# Altium footprint library JL_PCB.PCBLIB: 1129 footprints (part 8 of 72)
Each footprint in its own frame and in the unit in brackets; x right, y up, seen from the top. Pads: shape width x height; smd on the part's side, far side on the other; paste and mask are expansions set on the pad; w line width, h text height; cw(c..) or ccw(c..) is an arc to the next point about the centre after c.
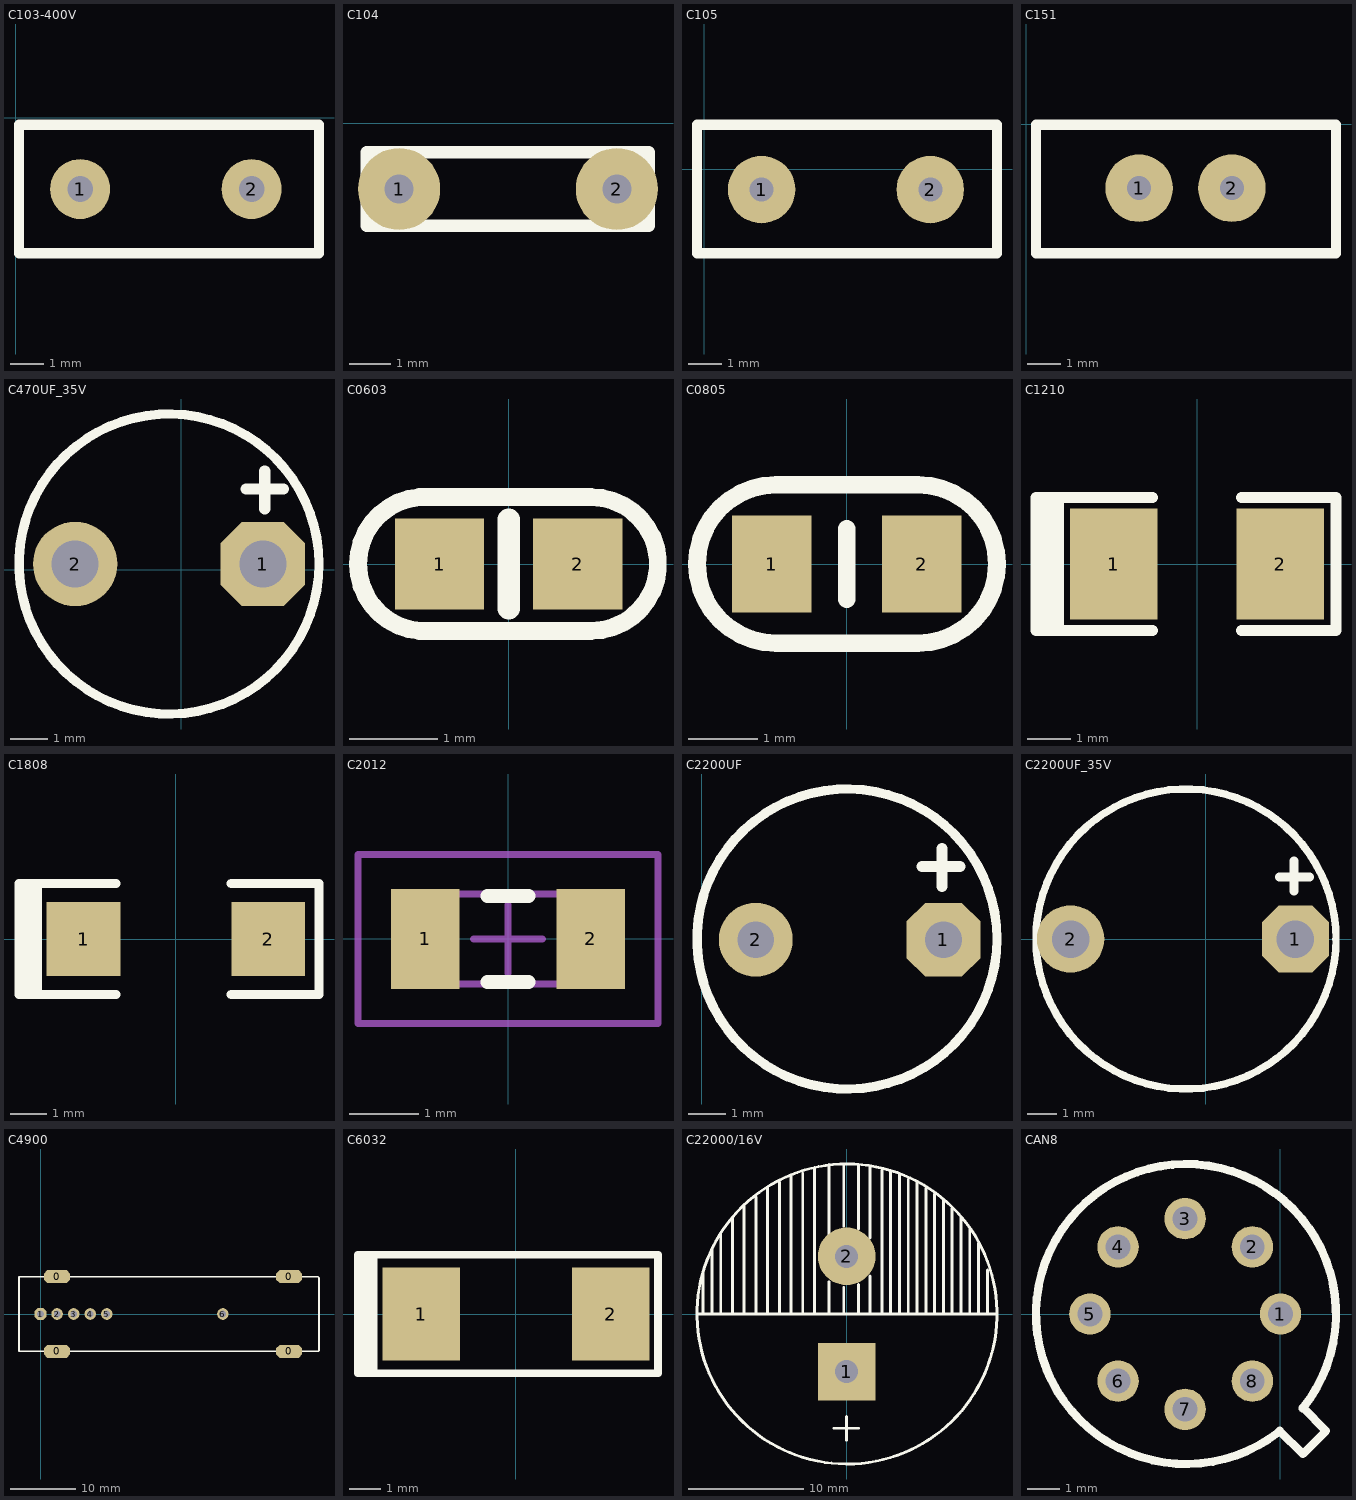
[diagram p7: the footprints below, top view; thin cyan lines are the x and y axes]

## C103-400V [mil]
pads (2):
  round 70 hole 30: 1(75,-83) 2(275,-83)
TopOverlay:
  lines w12: 3.61,-157.99 353.61,-157.99 353.61,-7.99 3.61,-7.99 3.61,-157.99

## C104 [mm]
pads (2):
  round 2 hole 0.711: 1(2.1,-1.6) 2(7.4,-1.6)
TopOverlay:
  lines w0.305: 1.311,-2.489 1.311,-0.711 8.169,-0.711 8.169,-2.489 1.311,-2.489

## C105 [mm]
pads (2):
  round 2 hole 0.711: 1(1.7,-0.6) 2(6.7,-0.6)
TopOverlay:
  lines w0.305: -0.213,-2.489 8.677,-2.489 8.677,1.321 -0.213,1.321 -0.213,-2.489

## C151 [mm]
pads (2):
  round 2 hole 0.711: 1(3.35,-1.9) 2(6.1,-1.9)
TopOverlay:
  lines w0.305: 0.295,-3.83 0.295,-0.02 9.185,-0.02 9.185,-3.83 0.295,-3.83

## C470UF_35V [mil]
pads (2):
  oct 90x90 hole 50: 1(87,6)
  round 90 hole 50: 2(-113,6)
TopOverlay:
  circle w10: c-13,6 r159.86
  lines w12: 69,86 109,86 ; 89,65 89,105

## C0603 [mil]
pads (2):
  rect 40x41 smd: 1(-31,0) 2(31,0)
TopOverlay:
  lines w8: -40.03,30 ccw(c-37.51,0) -39.97,-30 ; -40,-30 37,-30 ccw(c37,0) 37,30 -40,30
  lines w10: 0,-20 0,20
3D body "User Library-0603 SMD Capacitor.step": height 12.49, standoff 0.6, extent -30.49,-14.74 32.5,16.76

## C0805 [mil]
pads (2):
  rect 45x55 smd: 1(-42.5,0) 2(42.5,0)
TopOverlay:
  lines w10: 0,-20 0,20 ; -40,-45 cw(c-40,0) -40,45 40.25,45 cw(c40.25,0) 40.25,-45 -40,-45
3D body "CAPC2012(0805).STEP": height 37.4, standoff 0, extent -39,-22 39.74,25.24

## C1210 [mm]
pads (2):
  rect 2x2.54 smd: 1(-1.905,0) 2(1.905,0)
TopOverlay:
  lines w0.254: -3.429,-1.524 -3.429,1.524 ; -3.175,-1.524 -3.175,1.524 ; -1.016,-1.524 -3.683,-1.524 -3.683,1.524 -1.016,1.524 ; 1.016,-1.524 3.175,-1.524 3.175,1.524 1.016,1.524
3D body "CAPC3225(1210).STEP": height 1.3, standoff 0, extent -1.651,-1.245 1.549,1.255

## C1808 [mil]
pads (2):
  rect 80x80 smd: 1(-100,0) 2(100,0)
TopOverlay:
  lines w10: -160,-60 -160,60 ; -150,-55 -150,60 ; -65,-60 -170,-60 -170,60 -65,60 ; 60,-60 155,-60 155,60 60,60

## C2012 [mm] "Chip Capacitor, 2-Leads, Body 2.0x1.2mm, IPC Low Density"
height 0.6
pads (2):
  rect 1x1.45 smd: 1(-1.2,0) 2(1.2,0)
TopOverlay:
  lines w0.2: -0.3,-0.625 0.3,-0.625 ; -0.3,0.625 0.3,0.625
Mechanical13:
  lines w0.1: -1.05,-0.65 1.05,-0.65 1.05,0.65 -1.05,0.65 -1.05,-0.65
Mechanical15:
  lines w0.1: -0.5,0 0.5,0 ; 0,-0.5 0,0.5 ; -2.175,-1.225 2.175,-1.225 2.175,1.225 -2.175,1.225 -2.175,-1.225
3D body "C0805.STEP": height 0.5, standoff 0, extent -0.984,-0.6 1.016,0.6

## C2200UF [mm]
pads (2):
  oct 2x2 hole 1: 1(6.54,-6.63)
  round 2 hole 1: 2(1.46,-6.63)
TopOverlay:
  circle w0.254: c3.929,-6.61 r4.061
  lines w0.305: 5.969,-4.648 6.985,-4.648 ; 6.502,-5.182 6.502,-4.166
3D body "User Library-Capacitor, Al El, Thru Mt, 2200uF, 25V - CDE #SEK222M025ST.step": height 25.42, standoff -28.73, extent -2.608,-13.179 10.592,0.021

## C2200UF_35V [mil]
pads (2):
  oct 90x90 hole 50: 1(120,0)
  round 90 hole 50: 2(-180,0)
TopOverlay:
  circle w10: c-26,0 r200
  lines w12: 99,83 139,83 ; 118,64 118,104
3D body "User Library-Capacitor, Al El, Thru Mt, 2200uF, 25V - CDE #SEK222M025ST.step": height 1000.6, standoff -1131.29, extent -284.84,-253.69 234.84,266

## C4900 [mil]
pads (10):
  oct 157.48x78.74 smd: 0(100,-225) 0(100,225) 0(1500,-225) 0(1500,225)
  oct 70x70 hole 40: 1(0,0)
  round 70 hole 40: 2(100,0) 3(200,0) 4(300,0) 5(400,0) 6(1100,0)
TopOverlay:
  lines w10: 1675,225 -130,225 -130,-225 1675,-225 1680,-220 1680,218.98

## C6032 [mm]
pads (2):
  rect 2.5x3 smd: 1(-3.048,0) 2(3.048,0)
TopOverlay:
  lines w0.254: -4.826,1.905 -4.826,-1.905 -4.572,-1.905 ; -4.572,-1.905 -5.08,-1.905 -5.08,1.905 -4.572,1.905 ; -4.572,-1.905 -4.572,1.905 ; -4.572,-1.905 4.572,-1.905 4.572,1.905 -4.572,1.905

## C22000/16V [mm]
pads (2):
  rect 5x5 hole 2: 1(0,-5.004)
  round 5 hole 2: 2(0,5.004)
TopOverlay:
  lines w0.254: -12.954,0 0,0 12.954,0 ; -12.446,0 -12.446,3.556 ; -11.684,0 -11.684,5.588 ; -10.922,0 -10.922,6.858 ; -9.906,0 -9.906,8.382 ; -8.89,0 -8.89,9.398 ; -7.874,0 -7.874,10.16 ; -6.858,0 -6.858,10.922 ; -5.842,0 -5.842,11.43 ; -4.826,0 -4.826,11.938 ; -3.81,0 -3.81,12.192 ; -2.794,0 -2.794,12.7 ; -1.524,0 -1.524,2.794 ; -1.524,6.604 -1.524,12.954 ; -1.118,-9.906 1.016,-9.906 ; -0.254,0 -0.254,2.286 ; -0.254,7.62 -0.254,12.954 ; -0.051,-13.005 cw(c0.025,0) 0.025,-13.005 ; 0,-10.947 0,-8.89 ; 1.016,0 1.016,2.54 ; 1.016,7.366 1.016,12.954 ; 2.032,0 2.032,3.302 ; 2.032,6.604 2.032,12.7 ; 3.048,0 3.048,12.446 ; 3.81,0 3.81,12.446 ; 4.572,0 4.572,12.192 ; 5.334,0 5.334,11.684 ; 6.096,0 6.096,11.43 ; 6.858,0 6.858,10.922 ; 7.62,0 7.62,10.414 ; 8.382,0 8.382,9.906 ; 9.144,0 9.144,9.144 ; 9.906,0 9.906,8.382 ; 10.668,0 10.668,7.366 ; 11.43,0 11.43,6.096 ; 12.192,0 12.192,3.81

## CAN8 [mil]
pads (8):
  round 50 hole 30: 1(0,0) 2(-34,81) 3(-115,115) 4(-196,81) 5(-230,0) 6(-196,-81) 7(-115,-115) 8(-34,-81)
TopOverlay:
  lines w10: -2.57,-142.63 cw(c-114,0) 26.66,-113.91 ; -1,-141 27,-169 55,-141 27,-113